# Altium integrated library IEECS-Design-MainBoard.IntLib: 43 symbols
Pins are listed as number, name and electrical type; pins without a type are passive.

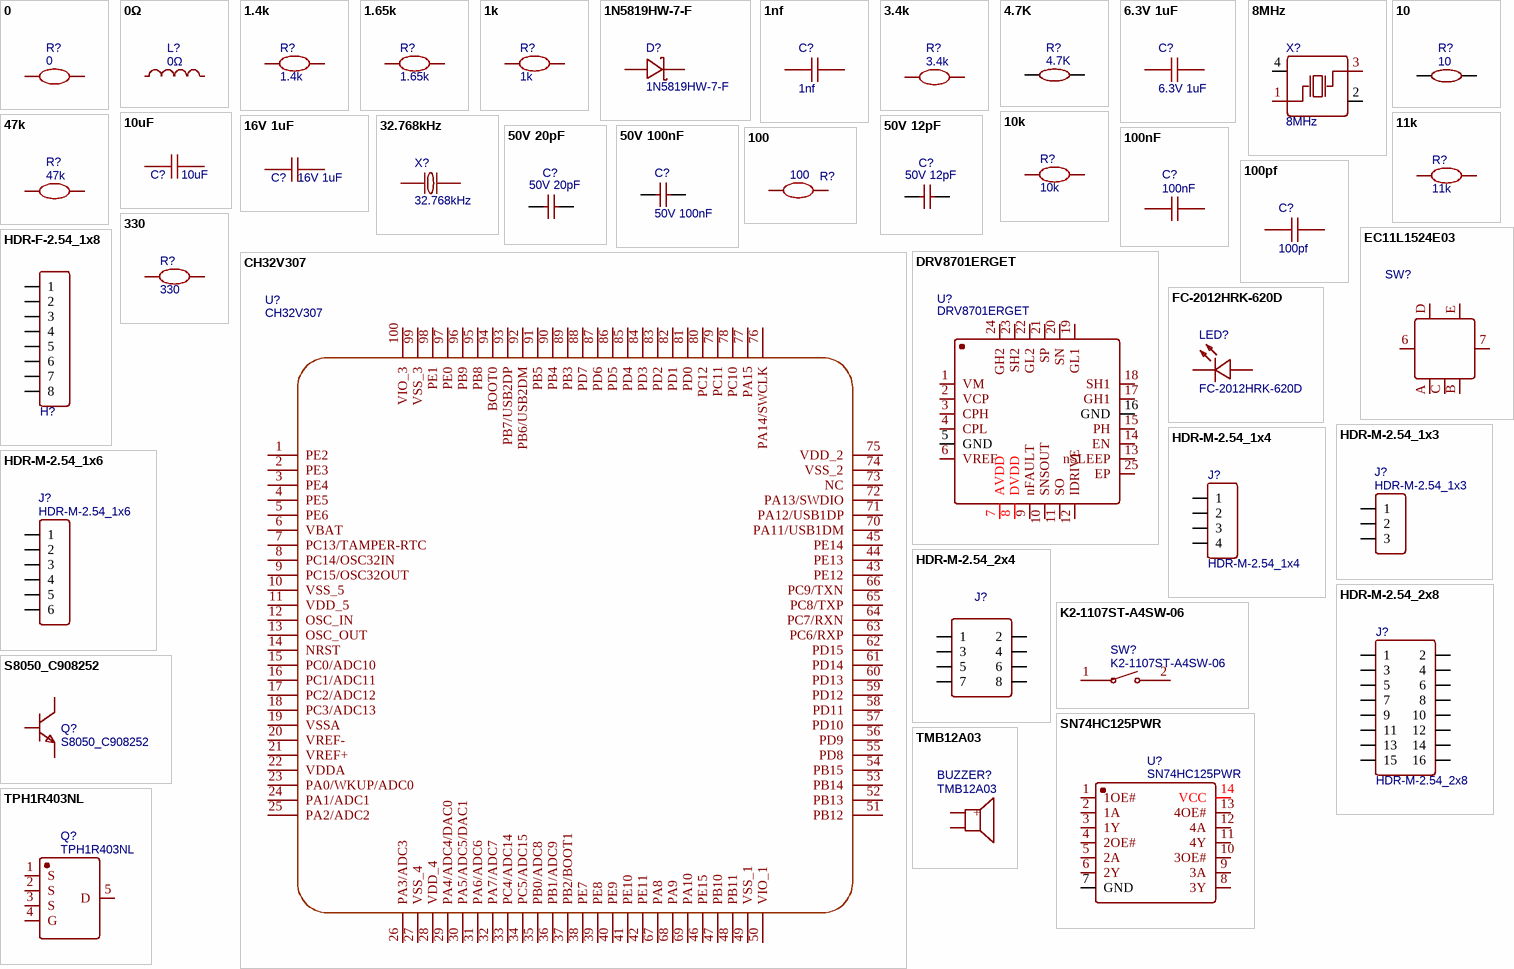
[diagram p0: symbols 0 to TPH1R403NL]

## 0
designator R?
nameAlias: Value(Ω); Contributor: LCEDA_Lib; spicePre: R; spiceSymbolName: R_0603_EU
footprint RES0603
pins: 1, 2

## 0Ω
designator L?
BOM_Manufacturer: FH; BOM_Manufacturer Part: CBG160808U000T; nameAlias: Value; BOM_Supplier: LCSC; BOM_Supplier Part: C43163; BOM_JLCPCB Part Class: Extended Part; spicePre: L; spiceSymbolName: CBG160808U000T
footprint RES0603
pins: 1, 2

## 1.4k
designator R?
nameAlias: Value(Ω); Contributor: LCEDA_Lib; spicePre: R; spiceSymbolName: R_0603_EU
footprint RES0603
pins: 1, 2

## 1.65k
designator R?
nameAlias: Value(Ω); Contributor: LCEDA_Lib; spicePre: R; spiceSymbolName: R_0603_EU
footprint RES0603
pins: 1, 2

## 1k
designator R?
nameAlias: Value(Ω); Contributor: LCEDA_Lib; spicePre: R; spiceSymbolName: R_0603_EU
footprint RES0603
pins: 1, 2

## 1N5819HW-7-F
designator D?
BOM_Manufacturer: DIODES; BOM_Supplier: LCSC; BOM_Manufacturer Part: 1N5819HW-7-F; image: //image.lceda.cn/szlcsc/C82544.jpg; BOM_Supplier Part: C82544; spicePre: D; spiceSymbolName: 1N5819HW-7-F
footprint Diode
pins: 1 A, 2 K

## 1nf
designator C?
nameAlias: Value(F); Contributor: LCEDA_Lib; spicePre: C; spiceSymbolName: C_0603_US
footprint CAP0603
pins: 1, 2

## 3.4k
designator R?
nameAlias: Value(Ω); Contributor: LCEDA_Lib; spicePre: R; spiceSymbolName: R_0603_EU
footprint RES0603
pins: 1, 2

## 4.7K
designator R?
BOM_Manufacturer: YAGEO; BOM_Manufacturer Part: RC0603FR-074K7L; nameAlias: Resistance (Ohms); BOM_Supplier: LCSC; BOM_Supplier Part: C99782; BOM_JLCPCB Part Class: Extended Part; spicePre: R; spiceSymbolName: RC0603FR-074K7L
footprint RES0603
pins: 1, 2

## 6.3V 1uF
designator C?
nameAlias: Value(F); Contributor: LCEDA_Lib; spicePre: C; spiceSymbolName: C_0603_US
footprint CAP0603
pins: 1, 2

## 8MHz
designator X?
BOM_Manufacturer: TAE; BOM_Manufacturer Part: SMD-5032_4P8M20pf20ppm; nameAlias: Frequency; Contributor: LCSC; BOM_Supplier: LCSC; BOM_Supplier Part: C133333; BOM_JLCPCB Part Class: Extended Part; spicePre: X; spiceSymbolName: SMD-5032_4P8M20PF20PPM
footprint OSC1
pins: 1 OSC1, 2 GND, 3 OSC2, 4 GND

## 10
designator R?
BOM_Manufacturer: YAGEO; BOM_Manufacturer Part: RC0603JR-0710RL; nameAlias: Resistance (Ohms); BOM_Supplier: LCSC; BOM_Supplier Part: C109317; BOM_JLCPCB Part Class: Extended Part; spicePre: R; spiceSymbolName: RC0603JR-0710RL
footprint RES0603
pins: 1, 2

## 10k
designator R?
nameAlias: Value(Ω); Contributor: LCEDA_Lib; spicePre: R; spiceSymbolName: R_0603_EU
footprint RES0603
pins: 1, 2

## 10uF
designator C?
nameAlias: Value(F); Contributor: LCEDA_Lib; spicePre: C; spiceSymbolName: C_0603_US
footprint CAP0603
pins: 1, 2

## 11k
designator R?
nameAlias: Value(Ω); Contributor: LCEDA_Lib; spicePre: R; spiceSymbolName: R_0603_EU
footprint RES0603
pins: 1, 2

## 16V 1uF
designator C?
nameAlias: Value(F); Contributor: LCEDA_Lib; spicePre: C; spiceSymbolName: C_0603_US
footprint CAP0603
pins: 1, 2

## 32.768kHz
designator X?
BOM_Manufacturer Part: Q13FC1350000400; BOM_Manufacturer: EPSON; nameAlias: Frequency; BOM_Supplier: LCSC; BOM_Supplier Part: C32346; BOM_JLCPCB Part Class: Basic Part; spicePre: X; spiceSymbolName: Q13FC1350000400
footprint OSC2
pins: 1, 2

## 47k
designator R?
nameAlias: Value(Ω); Contributor: LCEDA_Lib; spicePre: R; spiceSymbolName: R_0603_EU
footprint RES0603
pins: 1, 2

## 50V 12pF
designator C?
BOM_Manufacturer: YAGEO; BOM_Manufacturer Part: CC0603JRNPO9BN220; nameAlias: Capacitance; BOM_Supplier: LCSC; BOM_Supplier Part: C105620; BOM_JLCPCB Part Class: Extended Part; spicePre: C; spiceSymbolName: CC0603JRNPO9BN220
footprint CAP0603
pins: 1, 2

## 50V 20pF
designator C?
BOM_Manufacturer: YAGEO; BOM_Manufacturer Part: CC0603JRNPO9BN220; nameAlias: Capacitance; BOM_Supplier: LCSC; BOM_Supplier Part: C105620; BOM_JLCPCB Part Class: Extended Part; spicePre: C; spiceSymbolName: CC0603JRNPO9BN220
footprint CAP0603
pins: 1, 2

## 50V 100nF
designator C?
BOM_Manufacturer: YAGEO; BOM_Manufacturer Part: CC0603JRNPO9BN220; nameAlias: Capacitance; BOM_Supplier: LCSC; BOM_Supplier Part: C105620; BOM_JLCPCB Part Class: Extended Part; spicePre: C; spiceSymbolName: CC0603JRNPO9BN220
footprint CAP0603
pins: 1, 2

## 100
designator R?
nameAlias: Value(Ω); Contributor: LCEDA_Lib; spicePre: R; spiceSymbolName: R_0603_EU
footprint RES0603
pins: 1, 2

## 100nF
designator C?
BOM_Manufacturer: SAMSUNG; BOM_Manufacturer Part: CL10B104KC8NNNC; nameAlias: Capacitance; BOM_Supplier: LCSC; BOM_Supplier Part: C15725; BOM_JLCPCB Part Class: Extended Part; spicePre: C; spiceSymbolName: CL10B104KC8NNNC
footprint CAP0603
pins: 1, 2

## 100pf
designator C?
nameAlias: Value(F); Contributor: LCEDA_Lib; spicePre: C; spiceSymbolName: C_0603_US
footprint CAP0603
pins: 1, 2

## 330
designator R?
nameAlias: Value(Ω); Contributor: LCEDA_Lib; spicePre: R; spiceSymbolName: R_0603_EU
footprint RES0603
pins: 1, 2

## CH32V307
designator U?
Contributor: Aimmecat; spicePre: U; spiceSymbolName: CH32V307
footprint CH32V307
pins: 1 PE2, 2 PE3, 3 PE4, 4 PE5, 5 PE6, 6 VBAT, 7 PC13/TAMPER-RTC, 8 PC14/OSC32IN, 9 PC15/OSC32OUT, 10 VSS_5, 11 VDD_5, 12 OSC_IN, 13 OSC_OUT, 14 NRST, 15 PC0/ADC10, 16 PC1/ADC11, 17 PC2/ADC12, 18 PC3/ADC13, 19 VSSA, 20 VREF-, 21 VREF+, 22 VDDA, 23 PA0/WKUP/ADC0, 24 PA1/ADC1, 25 PA2/ADC2, 26 PA3/ADC3, 27 VSS_4, 28 VDD_4, 29 PA4/ADC4/DAC0, 30 PA5/ADC5/DAC1, 31 PA6/ADC6, 32 PA7/ADC7, 33 PC4/ADC14, 34 PC5/ADC15, 35 PB0/ADC8, 36 PB1/ADC9, 37 PB2/BOOT1, 38 PE7, 39 PE8, 40 PE9, 41 PE10, 42 PE11, 43 PE12, 44 PE13, 45 PE14, 46 PE15, 47 PB10, 48 PB11, 49 VSS_1, 50 VIO_1, 51 PB12, 52 PB13, 53 PB14, 54 PB15, 55 PD8, 56 PD9, 57 PD10, 58 PD11, 59 PD12, 60 PD13, 61 PD14, 62 PD15, 63 PC6/RXP, 64 PC7/RXN, 65 PC8/TXP, 66 PC9/TXN, 67 PA8, 68 PA9, 69 PA10, 70 PA11/USB1DM, 71 PA12/USB1DP, 72 PA13/SWDIO, 73 NC, 74 VSS_2, 75 VDD_2, 76 PA14/SWCLK, 77 PA15, 78 PC10, 79 PC11, 80 PC12, 81 PD0, 82 PD1, 83 PD2, 84 PD3, 85 PD4, 86 PD5, 87 PD6, 88 PD7, 89 PB3, 90 PB4, 91 PB5, 92 PB6/USB2DM, 93 PB7/USB2DP, 94 BOOT0, 95 PB8, 96 PB9, 97 PE0, 98 PE1, 99 VSS_3, 100 VIO_3

## DRV8701ERGET
designator U?
BOM_Manufacturer: TI; Contributor: LCSC; SMT Type: Extend; BOM_Supplier: LCSC; BOM_Manufacturer Part: DRV8701ERGET; BOM_Supplier Part: C132049; BOM_JLCPCB SMD: Yes; spicePre: U; spiceSymbolName: DRV8701ERGET
footprint DRV8701E
pins: 1 VM, 2 VCP, 3 CPH, 4 CPL, 5 GND, 6 VREF, 7 AVDD, 8 DVDD, 9 nFAULT, 10 SNSOUT, 11 SO, 12 IDRIVE, 13 nSLEEP, 14 EN, 15 PH, 16 GND, 17 GH1, 18 SH1, 19 GL1, 20 SN, 21 SP, 22 GL2, 23 SH2, 24 GH2, 25 EP

## EC11L1524E03
designator SW?  (value not drawn)
BOM_Manufacturer: ALPSALPINE(阿尔卑斯阿尔派); Contributor: LCSC; BOM_Supplier: LCSC; BOM_Supplier Part: C2687297; BOM_Manufacturer Part: EC11L1524E03; BOM_JLCPCB Part Class: Extended Part; spicePre: S; spiceSymbolName: EC11L1524E03
footprint encode_key (编码器开关)
pins: 6 EH, 7 EH, A, B, C, D, E

## FC-2012HRK-620D
designator LED?
BOM_Manufacturer: NATIONSTAR; BOM_Supplier: LCSC; BOM_Manufacturer Part: FC-2012HRK-620D; BOM_Supplier Part: C84256; BOM_JLCPCB Part Class: Basic Part; spicePre: L; spiceSymbolName: FC-2012HRK-620D
footprint LED0603
pins: 1 -, 2 +

## HDR-F-2.54_1x8
designator H?  (value not drawn)
Contributor: LCEDA_Lib; BOM_Supplier Part: C225505; BOM_Supplier: LCSC; spicePre: H; spiceSymbolName: HDR-F-2.54_1x8
footprint Pin1X8
pins: 1, 2, 3, 4, 5, 6, 7, 8

## HDR-M-2.54_1x3
designator J?
Contributor: LCEDA_Lib; BOM_Supplier Part: C180248; BOM_Supplier: LCSC; spicePre: J; spiceSymbolName: HDR-M-2.54_1x3
footprint Pin1X3
pins: 1, 2, 3

## HDR-M-2.54_1x4
designator J?
Contributor: LCEDA_Lib; BOM_Supplier Part: C124378; BOM_Supplier: LCSC; spicePre: J; spiceSymbolName: HDR-M-2.54_1x4
footprint Pin1X4
pins: 1, 2, 3, 4

## HDR-M-2.54_1x6
designator J?
Contributor: LCEDA_Lib; BOM_Supplier Part: C190819; BOM_Supplier: LCSC; spicePre: J; spiceSymbolName: HDR-M-2.54_1x6
footprint Pin1x6
pins: 1, 2, 3, 4, 5, 6

## HDR-M-2.54_2x4
designator J?  (value not drawn)
Contributor: LCEDA_Lib; BOM_Supplier Part: C58363; BOM_Supplier: LCSC; spicePre: J; spiceSymbolName: HDR-M-2.54_2x4
footprint Pin2X4
pins: 1, 2, 3, 4, 5, 6, 7, 8

## HDR-M-2.54_2x8
designator J?
Contributor: LCEDA_Lib; BOM_Supplier Part: C68234; BOM_Supplier: LCSC; spicePre: J; spiceSymbolName: HDR-M-2.54_2x8
footprint Pin2x8
pins: 1, 2, 3, 4, 5, 6, 7, 8, 9, 10, 11, 12, 13, 14, 15, 16

## K2-1107ST-A4SW-06
designator SW?
BOM_Manufacturer: Rectangular Connectors - Contacts; Contributor: LCSC; BOM_Supplier: LCSC; BOM_Supplier Part: C118141; BOM_Manufacturer Part: K2-1107ST-A4SW-06; BOM_JLCPCB Part Class: Extended Part; spicePre: S; spiceSymbolName: K2-1107ST-A4SW-06
footprint Key
pins: 1, 2

## S8050_C908252
designator Q?
BOM_Manufacturer: FUXINSEMI; BOM_Manufacturer Part: S8050; Contributor: LCSC; BOM_Supplier: LCSC; BOM_Supplier Part: C908252; BOM_JLCPCB Part Class: Extended Part; spicePre: Q; spiceSymbolName: S8050_C908252
footprint TRIODE
pins: 1 B, 2 E, 3 C

## SN74HC125PWR
designator U?
BOM_Manufacturer: Texas Instruments; Contributor: LCSC; SMT Type: Extend; BOM_Supplier: LCSC; BOM_Supplier Part: C132994; BOM_Manufacturer Part: SN74HC125PWR; BOM_JLCPCB SMD: Yes; spicePre: U; spiceSymbolName: SN74HC125PWR
footprint SN74HC125PWR
pins: 1 1OE#, 2 1A, 3 1Y, 4 2OE#, 5 2A, 6 2Y, 7 GND, 8 3Y, 9 3A, 10 3OE#, 11 4Y, 12 4A, 13 4OE#, 14 VCC

## TMB12A03
designator BUZZER?
BOM_Manufacturer: HNDZ; BOM_Supplier: LCSC; BOM_Manufacturer Part: TMB12A03; BOM_Supplier Part: C96222; BOM_JLCPCB Part Class: Extended Part; spicePre: B; spiceSymbolName: TMB12A03
footprint Buzzer
pins: 1 +, 2

## TPH1R403NL
designator Q?
BOM_Manufacturer: TOSHIBA; SMT Type: Extend; BOM_Supplier: LCSC; BOM_Manufacturer Part: TPH1R403NL; BOM_Supplier Part: C83440; BOM_JLCPCB SMD: Yes; spicePre: Q; spiceSymbolName: TPH1R403NL
footprint MOS
pins: 1 S, 2 S, 3 S, 4 G, 5 D

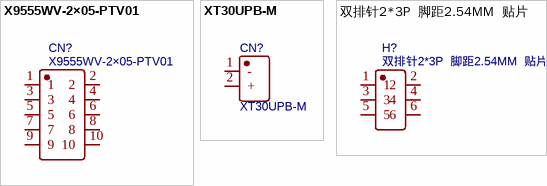
[diagram p1: symbols X9555WV-2×05-PTV01 to 双排针2*3P  脚距2.54MM  贴片]

## X9555WV-2×05-PTV01
designator CN?
BOM_Manufacturer: XKB Connectivity; Contributor: LCSC; BOM_Supplier: LCSC; BOM_Supplier Part: C706914; BOM_Manufacturer Part: X9555WV-2×05-PTV01; BOM_JLCPCB Part Class: Extended Part; spicePre: C; spiceSymbolName: X9555WV-2×05-PTV01
footprint Download
pins: 1, 2, 3, 4, 5, 6, 7, 8, 9, 10

## XT30UPB-M
designator CN?
BOM_Manufacturer: Changzhou Amass Elec; Contributor: LCSC; BOM_Supplier: LCSC; BOM_Supplier Part: C428721; BOM_Manufacturer Part: XT30UPB-M; BOM_JLCPCB Part Class: Extended Part; spicePre: C; spiceSymbolName: XT30UPB-M
footprint XT30
pins: 1 -, 2 +

## 双排针2*3P  脚距2.54MM  贴片
designator H?
BOM_Manufacturer: BOOMELE(博穆精密); Contributor: LCSC; BOM_Supplier: LCSC; BOM_Supplier Part: C77761; BOM_Manufacturer Part: 双排针2*3P  脚距2.54mm  贴片; BOM_JLCPCB Part Class: Extended Part; spicePre: H; spiceSymbolName: 双排针2*3P  脚距2.54MM  贴片
footprint Pin2X3
pins: 1, 2, 3, 4, 5, 6